# Altium footprint library Active.PcbLib: 308 footprints (part 12 of 22)
Each footprint in its own frame and in the unit in brackets; x right, y up, seen from the top. Pads: shape width x height; smd on the part's side, far side on the other; paste and mask are expansions set on the pad; w line width, h text height; cw(c..) or ccw(c..) is an arc to the next point about the centre after c.
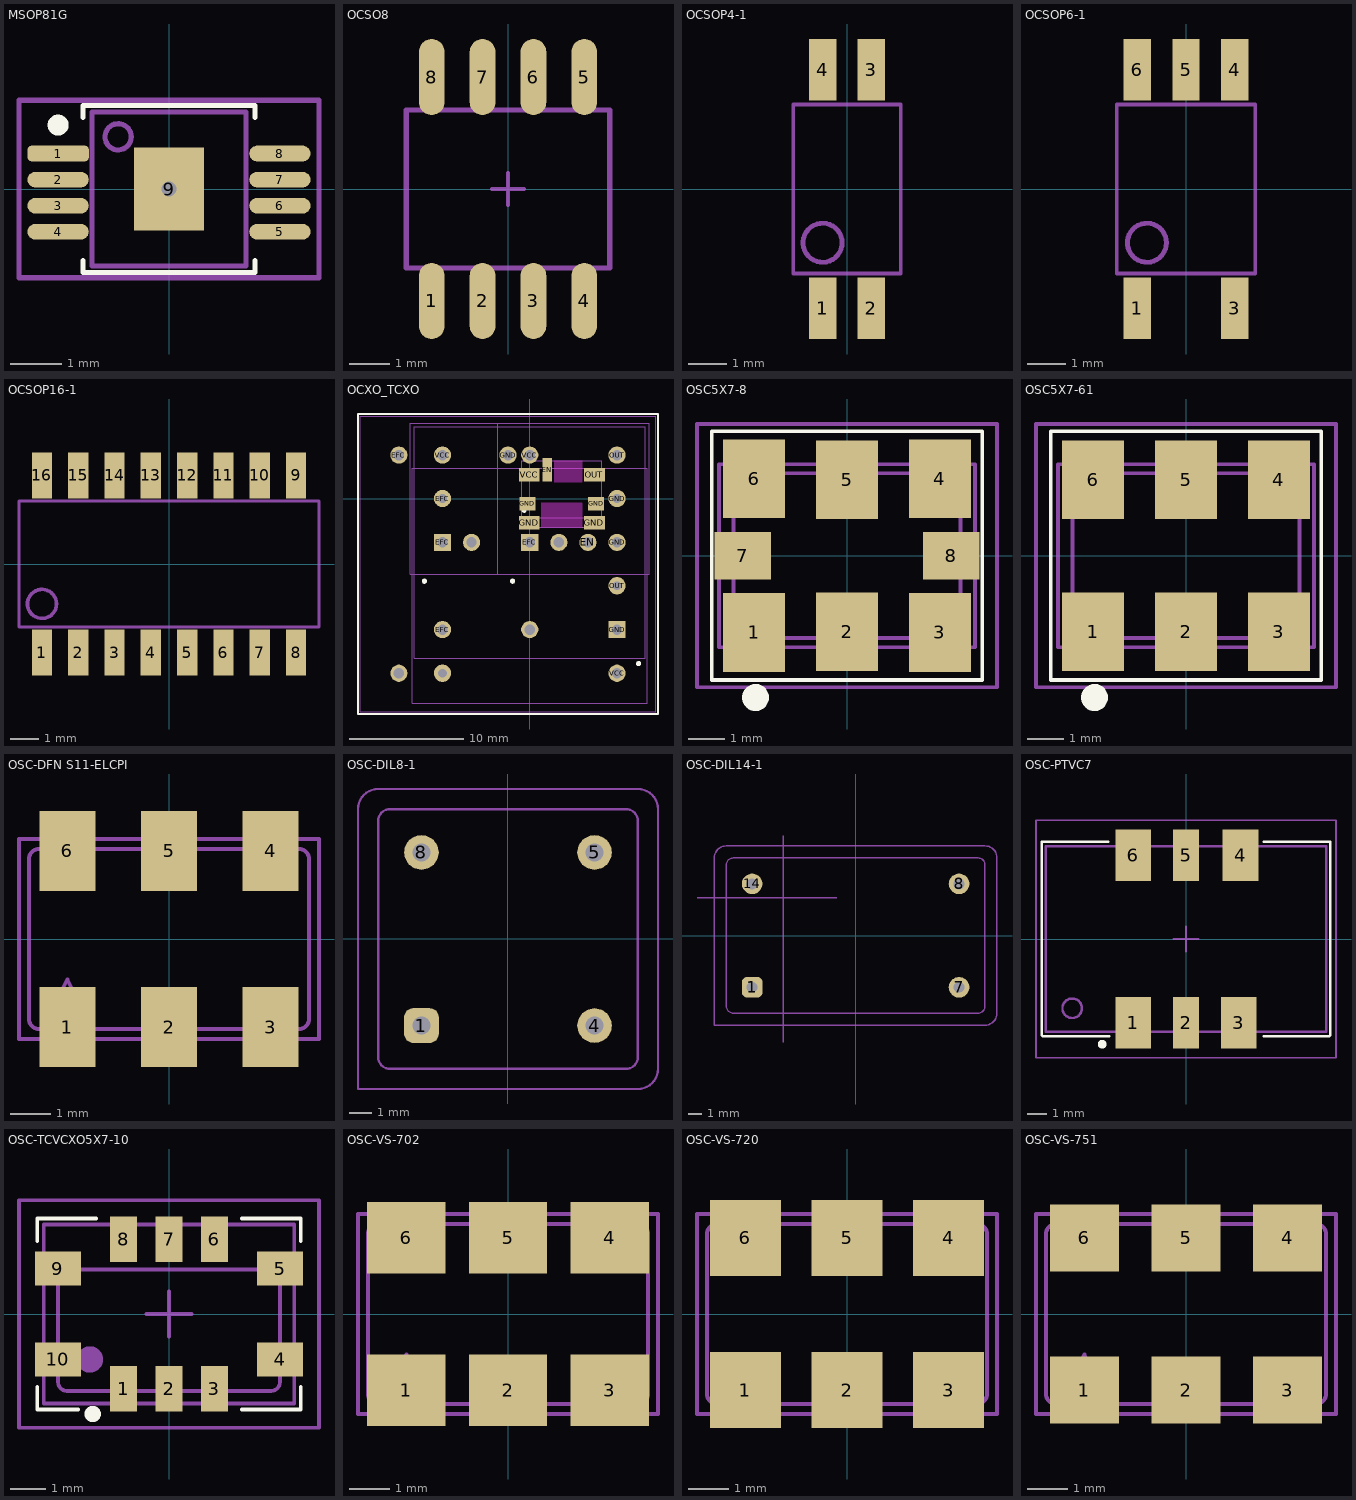
[diagram p11: the footprints below, top view; thin cyan lines are the x and y axes]

## MSOP81G [mil] "MSOP 8pin with power pad R0.5mm"
height 42.99
pads (9):
  rrect50% 47x12 smd mask+2: 1(-85,27.2)
  oval 47x12 smd mask+2: 2(-85,7.2) 3(-85,-12.8) 4(-85,-32.8)
  oval 47.01x12.01 smd mask+2: 5(85,-32.8) 6(85,-12.8) 7(85,7.2) 8(85,27.2)
  rect 54.02x64.02 smd paste-196.85 mask-196.85: 9(0,0)
via 0,0 diameter 25.59 hole 11.81
Top Overlay:
  circle w8: c-85,49 r4
  lines w4.02: -66,-55 -66,-64 66,-64 66,-55 ; -66,55 -66,64 66,64 66,55
Top Paste:
  region: -26.57,-5.91 -12.8,-5.91 -5.91,-12.8 5.91,-12.8 12.8,-5.91 26.57,-5.91 26.57,-31.5 -26.57,-31.5
  region: -26.57,5.91 -12.8,5.91 -5.91,12.8 5.91,12.8 12.8,5.91 26.57,5.91 26.57,31.5 -26.57,31.5
Top Solder:
  region: -28.54,33.46 0,33.46 0,13.05 -4.99,12.05 -9.22,9.22 -12.05,4.99 -13.05,0 -12.05,-4.99 -9.22,-9.22 -4.99,-12.05 0,-13.05 4.99,-12.05 9.22,-9.22 12.05,-4.99 13.05,0 12.05,4.99 9.22,9.22 4.99,12.05 0,13.05 0,12.8 0,33.46 28.54,33.46 28.54,-33.46 -28.54,-33.46
Mechanical 13:
  circle w3.94: c-39,40 r10.05
  lines w4.02: -59,-59 59,-59 59,59 -59,59 -59,-59
Mechanical 15:
  lines w4.02: -20.32,0 19.68,0 ; 0,-20 0,20 ; -115,-68 -115,68 115,68 115,-68 -115,-68
3D body: height 43, standoff 0, extent -59,-59 59,59

## OCSO8 [mm] "Optocoupler SO8 8pin"
height 3.2
pads (8):
  oval 0.64x1.9 smd: 1(-1.905,-2.795) 2(-0.635,-2.795) 3(0.635,-2.795) 4(1.905,-2.795) 5(1.905,2.795) 6(0.635,2.795) 7(-0.635,2.795) 8(-1.905,2.795)
Mechanical 13:
  lines w0.127: -2.54,-1.968 2.54,-1.968 2.54,1.968 -2.54,1.968 -2.54,-1.968
Mechanical 15:
  lines w0.102: -0.4,0 0.4,0 ; 0,-0.4 0,0.4
3D body: height 3.17, standoff 0, extent -2.54,-1.968 2.54,1.968
3D body: height 3.18, standoff 3.17, extent -2.308,-1.408 -1.492,-0.592
3D body: height 3.18, standoff 3.17, extent -2.54,-1.968 2.54,-1.7
3D body: height 1, standoff 0, extent 1.71,-3.3 2.11,-1.968
3D body: height 1, standoff 0, extent 0.44,-3.3 0.84,-1.968
3D body: height 1, standoff 0, extent -0.83,-3.3 -0.43,-1.968
3D body: height 1, standoff 0, extent -2.1,-3.3 -1.7,-1.968
3D body: height 1, standoff 0, extent 1.71,1.968 2.11,3.3
3D body: height 1, standoff 0, extent 0.44,1.968 0.84,3.3
3D body: height 1, standoff 0, extent -0.83,1.968 -0.43,3.3
3D body: height 1, standoff 0, extent -2.1,1.968 -1.7,3.3

## OCSOP4-1 [mm] "SOP 4pin  Optocoupler R1.27mm  10.5x4.4mm"
height 2.1
pads (4):
  rect 0.711x1.6 smd: 1(-0.635,-3.1) 2(0.635,-3.1) 3(0.635,3.1) 4(-0.635,3.1)
Mechanical 13:
  circle w0.127: c-0.635,-1.397 r0.508
  lines w0.102: -1.397,-2.2 1.397,-2.2 1.397,2.2 -1.397,2.2 -1.397,-2.2
3D body: height 2.15, standoff 2, extent -1.153,-1.915 -0.117,-0.879
3D body: height 2.1, standoff 0.1, extent -1.44,-2.2 1.397,2.2
3D body: height 1.05, standoff 0.9, extent -0.889,-3.048 -0.381,-2.2
3D body: height 0.15, standoff 0, extent -0.889,-3.556 -0.381,-2.921
3D body: height 1.05, standoff 0, extent -0.889,-3.048 -0.381,-2.921
3D body: height 1.05, standoff 0, extent 0.381,-3.048 0.889,-2.921
3D body: height 0.15, standoff 0, extent 0.381,-3.556 0.889,-2.921
3D body: height 1.05, standoff 0.9, extent 0.381,-3.048 0.889,-2.2
3D body: height 1.05, standoff 0.9, extent -0.889,2.2 -0.381,3.048
3D body: height 0.15, standoff 0, extent -0.889,2.921 -0.381,3.556
3D body: height 1.05, standoff 0, extent -0.889,2.921 -0.381,3.048
3D body: height 1.05, standoff 0.9, extent 0.381,2.2 0.889,3.048
3D body: height 0.15, standoff 0, extent 0.381,2.921 0.889,3.556
3D body: height 1.05, standoff 0, extent 0.381,2.921 0.889,3.048

## OCSOP6-1 [mm] "SOP 6pin  Optocoupler R1.27mm  10.5x4.4mm"
height 2.1
pads (5):
  rect 0.711x1.6 smd: 1(-1.27,-3.1) 3(1.27,-3.1) 4(1.27,3.1) 5(0,3.1) 6(-1.27,3.1)
Mechanical 13:
  circle w0.127: c-1.016,-1.397 r0.508
  lines w0.102: -1.8,-2.2 1.8,-2.2 1.8,2.2 -1.8,2.2 -1.8,-2.2
3D body: height 2.61, standoff 2, extent -1.534,-1.915 -0.498,-0.879
3D body: height 2.6, standoff 0.1, extent -1.8,-2.2 1.8,2.2
3D body: height 1.05, standoff 0.9, extent -1.524,-3.048 -1.016,-2.2
3D body: height 0.15, standoff 0, extent -1.524,-3.556 -1.016,-2.921
3D body: height 1.05, standoff 0, extent -1.524,-3.048 -1.016,-2.921
3D body: height 1.05, standoff 0, extent 1.016,-3.048 1.524,-2.921
3D body: height 0.15, standoff 0, extent 1.016,-3.556 1.524,-2.921
3D body: height 1.05, standoff 0.9, extent 1.016,-3.048 1.524,-2.2
3D body: height 1.05, standoff 0.9, extent -0.254,2.2 0.254,3.048
3D body: height 0.15, standoff 0, extent -0.254,2.921 0.254,3.556
3D body: height 1.05, standoff 0, extent -0.254,2.921 0.254,3.048
3D body: height 1.05, standoff 0.9, extent 1.016,2.2 1.524,3.048
3D body: height 0.15, standoff 0, extent 1.016,2.921 1.524,3.556
3D body: height 1.05, standoff 0, extent 1.016,2.921 1.524,3.048
3D body: height 1.05, standoff 0, extent -1.524,2.921 -1.016,3.048
3D body: height 0.15, standoff 0, extent -1.524,2.921 -1.016,3.556
3D body: height 1.05, standoff 0.9, extent -1.524,2.2 -1.016,3.048

## OCSOP16-1 [mm] "SOP 16pin  Optocoupler R1.27mm  10.5x4.4mm"
height 2.1
pads (16):
  rect 0.711x1.6 smd: 1(-4.445,-3.1) 2(-3.175,-3.1) 3(-1.905,-3.1) 4(-0.635,-3.1) 5(0.635,-3.1) 6(1.905,-3.1) 7(3.175,-3.1) 8(4.445,-3.1) 9(4.445,3.1) 10(3.175,3.1) 11(1.905,3.1) 12(0.635,3.1) 13(-0.635,3.1) 14(-1.905,3.1) 15(-3.175,3.1) 16(-4.445,3.1)
Mechanical 13:
  circle w0.127: c-4.445,-1.397 r0.508
  lines w0.102: -5.25,-2.2 5.25,-2.2 5.25,2.2 -5.25,2.2 -5.25,-2.2
3D body: height 2.15, standoff 2, extent -4.963,-1.915 -3.927,-0.879
3D body: height 2.1, standoff 0.1, extent -5.25,-2.2 5.25,2.2
3D body: height 1.05, standoff 0.9, extent -4.699,-3.048 -4.191,-2.2
3D body: height 0.15, standoff 0, extent -4.699,-3.556 -4.191,-2.921
3D body: height 1.05, standoff 0, extent -4.699,-3.048 -4.191,-2.921
3D body: height 1.05, standoff 0, extent -3.429,-3.048 -2.921,-2.921
3D body: height 0.15, standoff 0, extent -3.429,-3.556 -2.921,-2.921
3D body: height 1.05, standoff 0.9, extent -3.429,-3.048 -2.921,-2.2
3D body: height 1.05, standoff 0.9, extent -4.699,2.2 -4.191,3.048
3D body: height 0.15, standoff 0, extent -4.699,2.921 -4.191,3.556
3D body: height 1.05, standoff 0, extent -4.699,2.921 -4.191,3.048
3D body: height 1.05, standoff 0.9, extent -3.429,2.2 -2.921,3.048
3D body: height 0.15, standoff 0, extent -3.429,2.921 -2.921,3.556
3D body: height 1.05, standoff 0, extent -3.429,2.921 -2.921,3.048
3D body: height 1.05, standoff 0, extent -0.889,2.921 -0.381,3.048
3D body: height 0.15, standoff 0, extent -0.889,2.921 -0.381,3.556
3D body: height 1.05, standoff 0.9, extent -0.889,2.2 -0.381,3.048
3D body: height 1.05, standoff 0, extent -2.159,2.921 -1.651,3.048
3D body: height 0.15, standoff 0, extent -2.159,2.921 -1.651,3.556
3D body: height 1.05, standoff 0.9, extent -2.159,2.2 -1.651,3.048
3D body: height 1.05, standoff 0.9, extent -0.889,-3.048 -0.381,-2.2
3D body: height 0.15, standoff 0, extent -0.889,-3.556 -0.381,-2.921
3D body: height 1.05, standoff 0, extent -0.889,-3.048 -0.381,-2.921
3D body: height 1.05, standoff 0, extent -2.159,-3.048 -1.651,-2.921
3D body: height 0.15, standoff 0, extent -2.159,-3.556 -1.651,-2.921
3D body: height 1.05, standoff 0.9, extent -2.159,-3.048 -1.651,-2.2
3D body: height 1.05, standoff 0, extent 1.651,2.921 2.159,3.048
3D body: height 0.15, standoff 0, extent 1.651,2.921 2.159,3.556
3D body: height 1.05, standoff 0.9, extent 1.651,2.2 2.159,3.048
3D body: height 1.05, standoff 0, extent 0.381,2.921 0.889,3.048
3D body: height 0.15, standoff 0, extent 0.381,2.921 0.889,3.556
3D body: height 1.05, standoff 0.9, extent 0.381,2.2 0.889,3.048
3D body: height 1.05, standoff 0.9, extent 1.651,-3.048 2.159,-2.2
3D body: height 0.15, standoff 0, extent 1.651,-3.556 2.159,-2.921
3D body: height 1.05, standoff 0, extent 1.651,-3.048 2.159,-2.921
3D body: height 1.05, standoff 0, extent 0.381,-3.048 0.889,-2.921
3D body: height 0.15, standoff 0, extent 0.381,-3.556 0.889,-2.921
3D body: height 1.05, standoff 0.9, extent 0.381,-3.048 0.889,-2.2
3D body: height 1.05, standoff 0, extent 4.191,2.921 4.699,3.048
3D body: height 0.15, standoff 0, extent 4.191,2.921 4.699,3.556
3D body: height 1.05, standoff 0.9, extent 4.191,2.2 4.699,3.048
3D body: height 1.05, standoff 0, extent 2.921,2.921 3.429,3.048
3D body: height 0.15, standoff 0, extent 2.921,2.921 3.429,3.556
3D body: height 1.05, standoff 0.9, extent 2.921,2.2 3.429,3.048
3D body: height 1.05, standoff 0.9, extent 4.191,-3.048 4.699,-2.2
3D body: height 0.15, standoff 0, extent 4.191,-3.556 4.699,-2.921
3D body: height 1.05, standoff 0, extent 4.191,-3.048 4.699,-2.921
3D body: height 1.05, standoff 0, extent 2.921,-3.048 3.429,-2.921
3D body: height 0.15, standoff 0, extent 2.921,-3.556 3.429,-2.921
3D body: height 1.05, standoff 0.9, extent 2.921,-3.048 3.429,-2.2

## OCXO_TCXO [mm] "Grouped OCXO and TCXO footprint"
pads (27):
  round 1.5 hole 0.9: EFC(-11.43,3.81) EFC(-7.62,-11.43) EN(5.08,-3.81) GND(-1.9,3.81) GND(7.62,-3.81) OUT(7.62,3.81) VCC(-7.62,3.81) VCC(0,3.81) VCC(7.62,-15.24) VREF(-11.43,-15.24) VREF(-5.08,-3.81) VREF(0,-11.43) VREF(2.54,-3.81)
  rect 1.5x1.5 hole 0.9: EFC(-7.62,-3.81) EFC(0,-3.81) GND(7.62,-11.43)
  round 1.524 hole 0.762: EFC(-7.62,0.02) GND(7.62,0.02) OUT(7.62,-7.6) VREF(-7.62,-15.24)
  rect 0.8x2.04 smd: EN(1.53,2.52)
  rect 1.4x1.2 smd: GND(-0.2,-0.44) GND(5.8,-0.44)
  rect 1.8x1.2 smd: GND(-0.05,-2.1) GND(5.65,-2.1) OUT(5.65,2.1) VCC(-0.05,2.1)
Top Overlay:
  circle w0.254: c9.5,-14.4 r0.1
  circle w0.254: c-9.2,-7.2 r0.1
  circle w0.254: c-1.5,-7.2 r0.1
  circle w0.254: c-0.5,-1 r0.1
  lines w0.15: -15,-18.8 11.2,-18.8 11.2,7.4 -15,7.4 -15,-18.8
Keep-Out Layer:
  rectangle: 1,-2.5 4.6,-0.35
  rectangle: 2.1,1.4 4.6,3.33
Mechanical 13:
  lines w0.1: -10.42,6.6 -10.42,-6.61 -2.8,-6.61 ; -10.42,6.61 -2.8,6.61 10.42,6.61 10.42,-6.61 -2.8,-6.61 ; -2.8,6.6 -2.8,-6.61 ; -0.7,-1.67 6.3,-1.67 ; -14.81,-18.62 -14.81,7.19 11,7.19 11,-18.62 -14.81,-18.62 ; -10.25,-17.85 -10.25,2.65 10.25,2.65 10.25,-17.85 -10.25,-17.85 ; -10.1,-13.91 -10.1,6.29 10.1,6.29 10.1,-13.91 -10.1,-13.91 ; -0.7,-2.5 6.3,-2.5 6.3,3.33 -0.7,3.33 -0.7,-2.5
3D body: height 13, standoff 0.02, extent -14.8,-18.6 11,7.2

## OSC5X7-8 [mm] "Crystal oscillator 5x7x1.65mm 8pin"
height 1.65
pads (8):
  rect 1.7x2.15 smd mask+0.102: 1(-2.54,-2.1) 2(0,-2.075) 3(2.54,-2.1) 4(2.54,2.1) 5(0,2.075) 6(-2.54,2.1)
  rect 1.545x1.3 smd mask+0.102: 7(-2.852,0) 8(2.852,0)
Top Overlay:
  circle w0.381: c-2.5,-3.878 r0.178
  lines w0.102: -3.7,-3.4 3.7,-3.4 3.7,3.4 -3.7,3.4 -3.7,-3.4
Mechanical 13:
  circle w0.381: c-2.3,-1.5 r0.178
  lines w0.102: -3.5,-2.5 -3.5,2.5 3.5,2.5 3.5,-2.5 -3.5,-2.5 ; -3.1,-2 ccw(c-2.85,-2) -2.85,-2.25 2.85,-2.25 ccw(c2.85,-2) 3.1,-2 3.1,2 ccw(c2.85,2) 2.85,2.25 -2.85,2.25 ccw(c-2.85,2) -3.1,2 -3.1,-2
Mechanical 15:
  lines w0.102: -4.1,-3.6 -4.1,3.6 4.1,3.6 4.1,-3.6 -4.1,-3.6
3D body: height 1.67, standoff 1.65, extent -2.606,-1.806 -1.994,-1.194
3D body: height 1.3, standoff 0, extent -3.5,-2.5 3.5,2.5
3D body: height 1.65, standoff 1.3, extent -3.101,-2.263 3.101,2.263

## OSC5X7-61 [mm] "Crystal oscillator 5x7x1.65mm 6pin"
height 1.65
pads (6):
  rect 1.7x2.15 smd mask+0.102: 1(-2.54,-2.075) 2(0,-2.075) 3(2.54,-2.075) 4(2.54,2.075) 5(0,2.075) 6(-2.54,2.075)
Top Overlay:
  circle w0.381: c-2.5,-3.878 r0.178
  lines w0.102: -3.7,-3.4 3.7,-3.4 3.7,3.4 -3.7,3.4 -3.7,-3.4
Mechanical 13:
  circle w0.381: c-2.3,-1.5 r0.178
  lines w0.102: -3.5,-2.5 -3.5,2.5 3.5,2.5 3.5,-2.5 -3.5,-2.5 ; -3.1,-2 ccw(c-2.85,-2) -2.85,-2.25 2.85,-2.25 ccw(c2.85,-2) 3.1,-2 3.1,2 ccw(c2.85,2) 2.85,2.25 -2.85,2.25 ccw(c-2.85,2) -3.1,2 -3.1,-2
Mechanical 15:
  lines w0.102: -4.1,-3.6 -4.1,3.6 4.1,3.6 4.1,-3.6 -4.1,-3.6
3D body: height 1.67, standoff 1.65, extent -2.606,-1.806 -1.994,-1.194
3D body: height 1.3, standoff 0, extent -3.5,-2.5 3.5,2.5
3D body: height 1.65, standoff 1.3, extent -3.101,-2.263 3.101,2.263

## OSC-DFN S11-ELCPI [mm] "Oscillator ceramic 5x7.5x1.7mm"
height 1.7
pads (6):
  rect 1.4x2 smd: 1(-2.54,-2.2) 2(0,-2.2) 3(2.54,-2.2) 4(2.54,2.2) 5(0,2.2) 6(-2.54,2.2)
Mechanical 13:
  lines w0.102: -3.75,-2.5 3.75,-2.5 3.75,2.5 -3.75,2.5 -3.75,-2.5 ; -3.5,-2 ccw(c-3.25,-2) -3.25,-2.25 3.25,-2.25 ccw(c3.25,-2) 3.5,-2 3.5,2 ccw(c3.25,2) 3.25,2.25 -3.25,2.25 ccw(c-3.25,2) -3.5,2 -3.5,-2 ; -3.04,-2.016 -2.54,-1.016 -2.04,-2.016 -3.04,-2.016
3D body: height 1.7, standoff 1.6, extent -3.505,-2.255 3.505,2.255
3D body: height 1.6, standoff 0, extent -3.75,-2.5 3.75,2.5

## OSC-DIL8-1 [mil] "Oscillator dip 4pin 13.2x13.2x7.6mm"
height 314.96
pads (4):
  rrect50% 60x60 hole 31.5: 1(-150,-150)
  round 60 hole 31.5: 4(150,-150) 5(150,150) 8(-150,150)
Mechanical 13:
  lines w3.94: -260,-260 225,-260 ccw(c225,-225) 260,-225 260,225 ccw(c225,225) 225,260 -225,260 ccw(c-225,225) -260,225 -260,-260 ; -225,-205 ccw(c-205,-205) -205,-225 205,-225 ccw(c205,-205) 225,-205 225,205 ccw(c205,205) 205,225 -205,225 ccw(c-205,205) -225,205 -225,-205
3D body: height 31.5, standoff 3.94, extent -200.43,99.57 -99.57,200.43
3D body: height 31.5, standoff 3.94, extent 99.57,99.57 200.43,200.43
3D body: height 31.5, standoff 3.94, extent 99.57,-200.43 200.43,-99.57
3D body: height 300.39, standoff 300, extent -165.29,-165.29 -134.71,-134.71
3D body: height 118.11, standoff 98.43, extent -260.3,-260.3 260.3,260.3
3D body: height 300, standoff 118.11, extent -225.39,-225.39 225.39,225.39
3D body: height 98.43, standoff 31.5, extent -225.39,-225.39 225.39,225.39

## OSC-DIL14-1 [mil] "Oscillator dip 14 4pin 20.2x13.2x7.6mm"
height 314.96
pads (4):
  rrect50% 60x60 hole 31.5: 1(-300,-150)
  round 60 hole 31.5: 7(300,-150) 8(300,150) 14(-300,150)
Mechanical 13:
  lines w3.94: -410,-260 375,-260 ccw(c375,-225) 410,-225 410,225 ccw(c375,225) 375,260 -375,260 ccw(c-375,225) -410,225 -410,-260 ; -375,-205 ccw(c-355,-205) -355,-225 355,-225 ccw(c355,-205) 375,-205 375,205 ccw(c355,205) 355,225 -355,225 ccw(c-355,205) -375,205 -375,-205
Mechanical 15:
  lines w3.94: -460,110 -55,110 ; -210,-310 -210,290
3D body: height 80, standoff 0, extent -249.58,70.17 -170,149.83
3D body: height 300.39, standoff 300, extent -315.29,-165.29 -284.71,-134.71
3D body: height 60, standoff 40, extent -410.3,-260.3 410.3,260.3
3D body: height 80, standoff 0, extent 170,70.17 249.58,149.83
3D body: height 80, standoff 0, extent 170,-149.83 249.58,-70.17
3D body: height 80, standoff 0, extent -249.58,-149.83 -170,-70.17
3D body: height 360, standoff 60, extent -375.39,-225.39 375.39,225.39

## OSC-PTVC7 [mil] "Oscilator 14.4x9.5mm 6 pin"
height 275.59
pads (6):
  rect 72x104 smd: 1(-106.3,-169.29) 3(106.3,-169.29) 4(110.24,169.29) 6(-106.3,169.29)
  rect 52x104 smd: 2(0,-169.29) 5(0,169.29)
Top Overlay:
  circle w10: c-169.29,-212.6 r3.94
  lines w5: -157.48,196.85 -291.34,196.85 -291.34,-194.88 -289.37,-196.85 -155.51,-196.85 ; 157.48,-196.85 289.37,-196.85 291.34,-194.88 291.34,196.85 157.48,196.85
Mechanical 13:
  circle w5: c-230,-140 r19.68
  lines w5: -283.46,-187.01 -283.46,187.01 283.46,187.01 283.46,-187.01 -283.46,-187.01
Mechanical 15:
  lines w3.94: -25,0 25,0 ; 0,-25 0,25
  lines w4: -303.15,-240 -303.15,240 303.15,240 303.15,-240 -303.15,-240
3D body: height 236.22, standoff 0, extent -283.46,-187.01 283.46,187.01

## OSC-TCVCXO5X7-10 [mm] "Oscillator ceramic leadless 5x7x2mm"
height 2.5
pads (10):
  rect 0.76x1.28 smd: 1(-1.27,-2.09) 2(0,-2.09) 3(1.27,-2.09) 6(1.27,2.09) 7(0,2.09) 8(-1.27,2.09)
  rect 1.28x0.94 smd: 4(3.105,-1.27) 5(3.105,1.27) 9(-3.105,1.27) 10(-3.105,-1.27)
Top Overlay:
  circle w0.254: c-2.132,-2.794 r0.1
  lines w0.102: -3.683,-2.032 -3.683,-2.667 -2.54,-2.667 ; -3.683,2.032 -3.683,2.667 -2.032,2.667 ; 2.032,-2.667 3.683,-2.667 3.683,-2.032 ; 2.032,2.667 3.683,2.667 3.683,2.032
Mechanical 13:
  circle w0.381: c-2.21,-1.27 r0.178
  lines w0.102: -3.1,0.997 -3.1,-1.9 ccw(c-2.85,-1.9) -2.85,-2.15 2.85,-2.15 ccw(c2.85,-1.9) 3.1,-1.9 3.1,0.995 ; -3.092,0.997 cw(c-2.845,0.997) -2.845,1.245 2.845,1.245 cw(c2.845,0.995) 3.095,0.995 ; -3.5,-2.5 -3.5,2.5 3.5,2.5 3.5,-2.5 -3.5,-2.5
Mechanical 15:
  lines w0.1: -0.635,0 0.635,0 ; 0,-0.635 0,0.635
  lines w0.102: -4.191,-3.175 -4.191,3.175 4.191,3.175 4.191,-3.175 -4.191,-3.175
3D body: height 2.01, standoff 2, extent -2.546,-1.607 -1.874,-0.933
3D body: height 2, standoff 1, extent -3.101,-2.161 3.101,1.247
3D body: height 1, standoff 0, extent -3.5,-2.504 3.5,2.5

## OSC-VS-702 [mm] "Oscillator ceramic leadless 5x7.5x2mm"
height 2
pads (6):
  rect 1.96x1.78 smd mask+0.127: 1(-2.54,-1.905) 2(0,-1.905) 3(2.54,-1.905) 4(2.54,1.905) 5(0,1.905) 6(-2.54,1.905)
Mechanical 13:
  lines w0.102: -3.75,-2.5 3.75,-2.5 3.75,2.5 -3.75,2.5 -3.75,-2.5 ; -3.5,-2 ccw(c-3.25,-2) -3.25,-2.25 3.25,-2.25 ccw(c3.25,-2) 3.5,-2 3.5,2 ccw(c3.25,2) 3.25,2.25 -3.25,2.25 ccw(c-3.25,2) -3.5,2 -3.5,-2 ; -3.04,-2.016 -2.54,-1.016 -2.04,-2.016 -3.04,-2.016
3D body: height 2, standoff 1.8, extent -3.505,-2.255 3.505,2.255
3D body: height 1.8, standoff 0, extent -3.75,-2.5 3.75,2.5

## OSC-VS-720 [mm] "Oscillator ceramic leadless 5x7.5x2mm"
height 2
pads (6):
  rect 1.78x1.9 smd mask+0.254: 1(-2.54,-1.905) 2(0,-1.905) 3(2.54,-1.905) 4(2.54,1.905) 5(0,1.905) 6(-2.54,1.905)
Mechanical 13:
  lines w0.102: -3.75,-2.5 -3.75,2.5 3.75,2.5 3.75,-2.5 -3.75,-2.5 ; -3.5,-2 ccw(c-3.25,-2) -3.25,-2.25 3.25,-2.25 ccw(c3.25,-2) 3.5,-2 3.5,2 ccw(c3.25,2) 3.25,2.25 -3.25,2.25 ccw(c-3.25,2) -3.5,2 -3.5,-2 ; -3.04,-2.016 -2.04,-2.016 -2.54,-1.016 -3.04,-2.016
3D body: height 1.8, standoff 0, extent -3.75,-2.5 3.75,2.5
3D body: height 2, standoff 1.8, extent -3.505,-2.255 3.505,2.255

## OSC-VS-751 [mil] "Oscillator ceramic leadless 5x7.5x2.5mm"
height 98.43
pads (6):
  rect 68x66 smd mask+10: 1(-100,-75) 2(0,-75) 3(100,-75) 4(100,75) 5(0,75) 6(-100,75)
Mechanical 13:
  lines w4: -147.64,-98.43 -147.64,98.43 147.64,98.43 147.64,-98.43 -147.64,-98.43 ; -137.8,-78.74 ccw(c-127.95,-78.74) -127.95,-88.58 127.95,-88.58 ccw(c127.95,-78.74) 137.8,-78.74 137.8,78.74 ccw(c127.95,78.74) 127.95,88.58 -127.95,88.58 ccw(c-127.95,78.74) -137.8,78.74 -137.8,-78.74 ; -119.69,-79.37 -80.31,-79.37 -100,-40 -119.69,-79.37
3D body: height 90.55, standoff 0, extent -147.64,-98.43 147.64,98.43
3D body: height 98.43, standoff 90.55, extent -137.99,-88.78 137.99,88.78